# Altium integrated library ALTIUM-MJ_HORIZONTAL_PLASTIC-rev16a.IntLib: 68 symbols
Pins are listed as number, name and electrical type; pins without a type are passive.

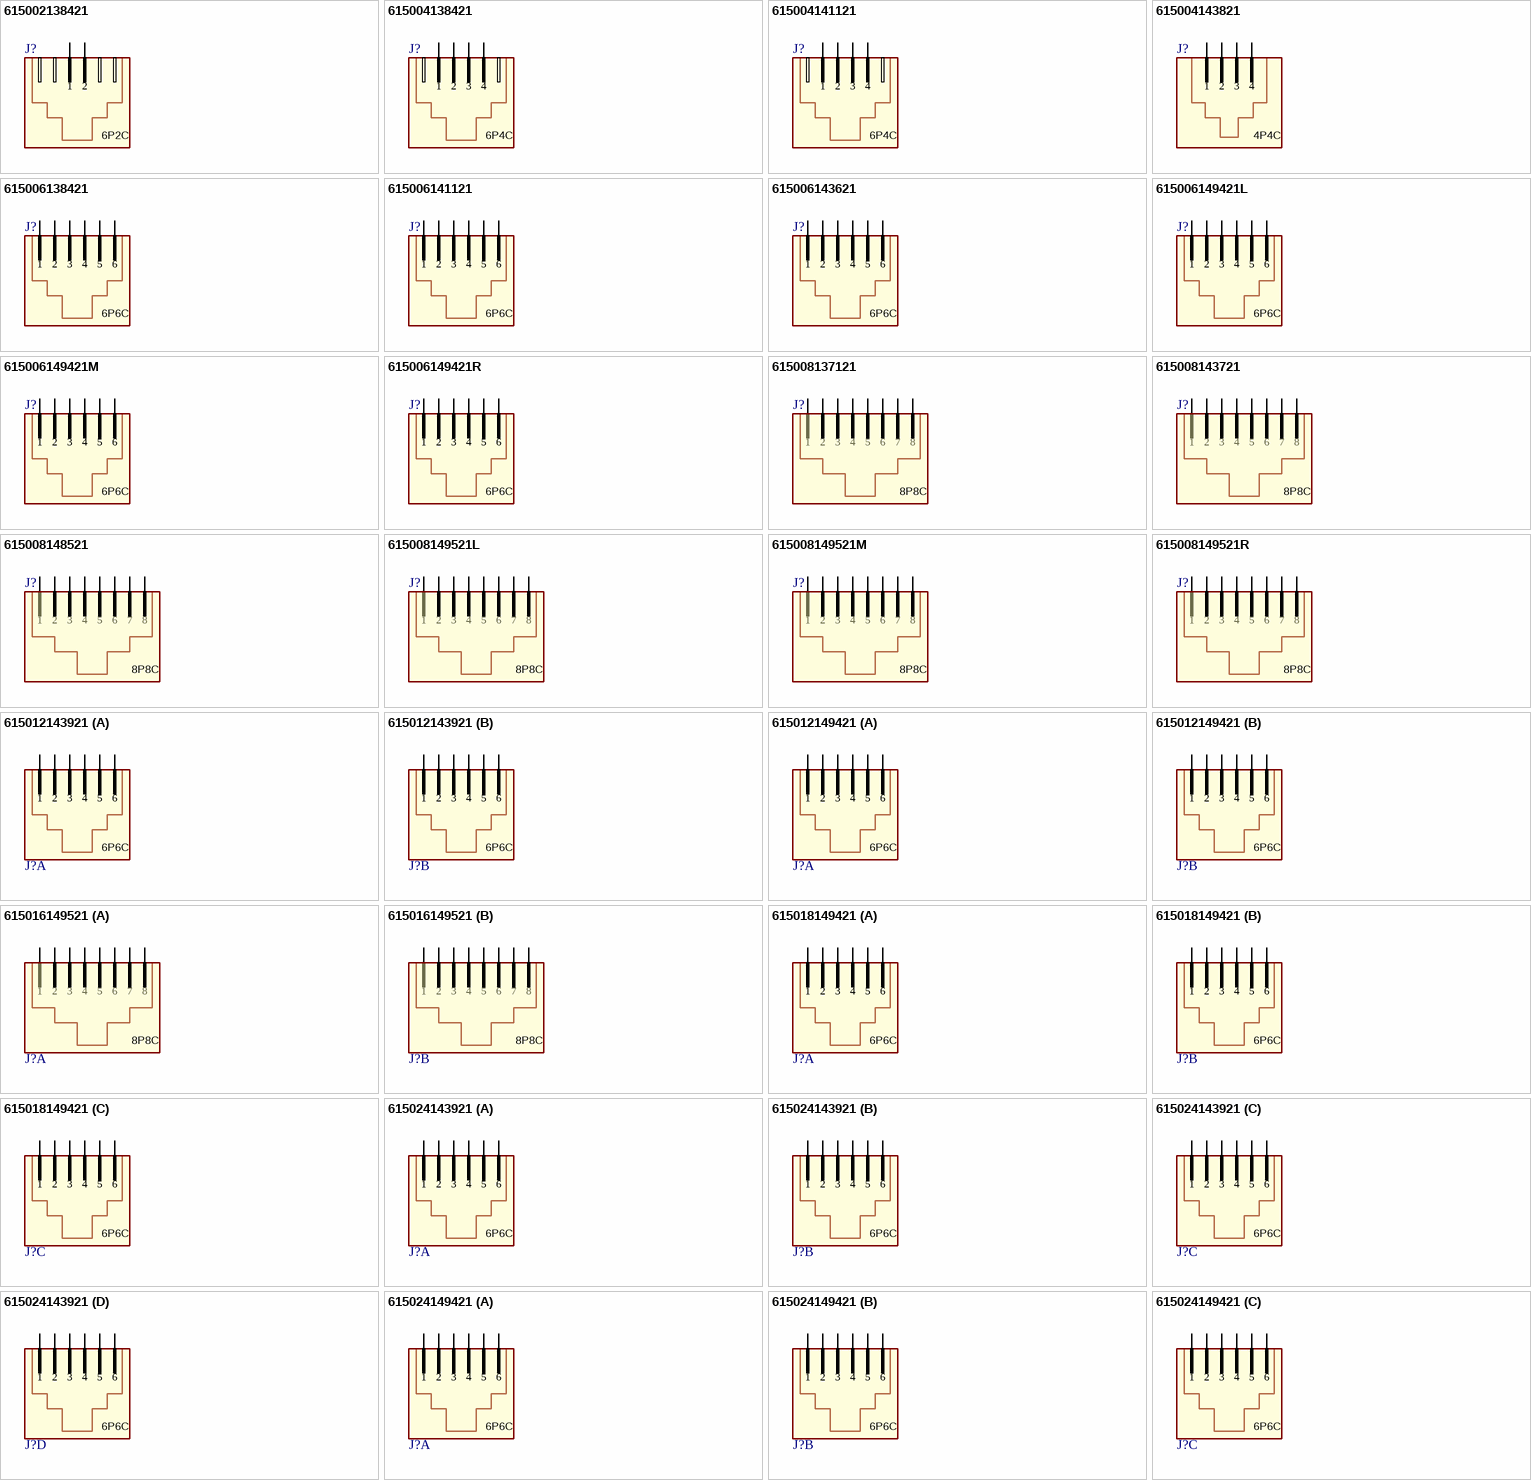
[diagram p0: symbols 615002138421 to 615024149421]

## 615002138421
designator J?
WR-MJ Modular Jack Horizontal Plastic 6P2C Tab Up; PartNumber: 615002138421; PublishedDate: July 2016; Publisher: Wurth Elektronik; ComponentLink1Description: Manufacturer; ComponentLink1URL: http://www.we-online.de; ComponentLink2Description: Datasheet; ComponentLink2URL: http://katalog.we-online.de/em/datasheet/615002138421.pdf; PinNumber: 6P2C
footprint 615002138421 (Horizontal Plastic 1x1 TH    6P2C Tab Up)
pins: 1, 2

## 615004138421
designator J?
WR-MJ Modular Jack Horizontal Plastic 6P4C Tab Up; PartNumber: 615004138421; PublishedDate: July 2016; Publisher: Wurth Elektronik; ComponentLink1Description: Manufacturer; ComponentLink1URL: http://www.we-online.de; ComponentLink2Description: Datasheet; ComponentLink2URL: http://katalog.we-online.de/em/datasheet/615004138421.pdf; PinNumber: 6P4C
footprint 615004138421 (Horizontal Plastic 1x1 TH    6P4C Tab Up)
pins: 1, 2, 3, 4

## 615004141121
designator J?
WR-MJ Modular Jack Horizontal Plastic 6P4C Tab Down; PartNumber: 615004141121; PublishedDate: July 2016; Publisher: Wurth Elektronik; ComponentLink1Description: Manufacturer; ComponentLink1URL: http://www.we-online.de; ComponentLink2Description: Datasheet; ComponentLink2URL: http://katalog.we-online.de/em/datasheet/615004141121.pdf; PinNumber: 6P4C
footprint 615004141121 (Horizontal Plastic 1x1 TH    6P4C Tab Down)
pins: 1, 2, 3, 4

## 615004143821
designator J?
WR-MJ Modular Jack Horizontal Plastic 4P4C Tab Up; PartNumber: 615004143821; PublishedDate: July 2016; Publisher: Wurth Elektronik; ComponentLink1Description: Manufacturer; ComponentLink1URL: http://www.we-online.de; ComponentLink2Description: Datasheet; ComponentLink2URL: http://katalog.we-online.de/em/datasheet/615004143821.pdf; PinNumber: 4P4C
footprint 615004143821 (Horizontal Plastic 1x1 TH    4P4C Tab Up)
pins: 1, 2, 3, 4

## 615006138421
designator J?
WR-MJ Modular Jack Horizontal Plastic 6P6C Tab Up; PartNumber: 615006138421; PublishedDate: July 2016; Publisher: Wurth Elektronik; ComponentLink1Description: Manufacturer; ComponentLink1URL: http://www.we-online.de; ComponentLink2Description: Datasheet; ComponentLink2URL: http://katalog.we-online.de/em/datasheet/615006138421.pdf; PinNumber: 6P6C
footprint 615006138421 (Horizontal Plastic 1x1 TH  6P6C Tab Up)
pins: 1, 2, 3, 4, 5, 6

## 615006141121
designator J?
WR-MJ Modular Jack Horizontal Plastic 6P6C Tab Down; PartNumber: 615006141121; PublishedDate: July 2016; Publisher: Wurth Elektronik; ComponentLink1Description: Manufacturer; ComponentLink1URL: http://www.we-online.de; ComponentLink2Description: Datasheet; ComponentLink2URL: http://katalog.we-online.de/em/datasheet/615006141121.pdf; PinNumber: 6P6C
footprint 615006141121 (Horizontal Plastic 1x1 TH    6P6C Tab Down)
pins: 1, 2, 3, 4, 5, 6

## 615006143621
designator J?
WR-MJ Modular Jack Horizontal Plastic 6P6C Tab Down; PartNumber: 615006143621; PublishedDate: July 2016; Publisher: Wurth Elektronik; ComponentLink1Description: Manufacturer; ComponentLink1URL: http://www.we-online.de; ComponentLink2Description: Datasheet; ComponentLink2URL: http://katalog.we-online.de/em/datasheet/615006143621.pdf; PinNumber: 6P6C
footprint 615006143621 (Horizontal Plastic 1x1 TH    6P6C Tab Down)
pins: 1, 2, 3, 4, 5, 6

## 615006149421L
designator J?
WR-MJ Modular Jack Horizontal Plastic 6P6C Assembly Tab Up; PartNumber: 615006149421L; PublishedDate: July 2016; Publisher: Wurth Elektronik; ComponentLink1Description: Manufacturer; ComponentLink1URL: http://www.we-online.de; ComponentLink2Description: Datasheet; ComponentLink2URL: http://katalog.we-online.de/em/datasheet/615006149421L.pdf; PinNumber: 6P6C
footprint 615006149421L (WR-MJ_Modular Jack_Tab UP_6P6C Assembly Left Housing)
pins: 1, 2, 3, 4, 5, 6

## 615006149421M
designator J?
WR-MJ Modular Jack Horizontal Plastic 6P6C Assembly Tab Up; PartNumber: 615006149421M; PublishedDate: July 2016; Publisher: Wurth Elektronik; ComponentLink1Description: Manufacturer; ComponentLink1URL: http://www.we-online.de; ComponentLink2Description: Datasheet; ComponentLink2URL: http://katalog.we-online.de/em/datasheet/615006149421M.pdf; PinNumber: 6P6C
footprint 615006149421M (WR-MJ_Modular Jack_Tab UP_6P6C Assembly Middlet Housing)
pins: 1, 2, 3, 4, 5, 6

## 615006149421R
designator J?
WR-MJ Modular Jack Horizontal Plastic 6P6C Assembly Tab Up; PartNumber: 615006149421R; PublishedDate: July 2016; Publisher: Wurth Elektronik; ComponentLink1Description: Manufacturer; ComponentLink1URL: http://www.we-online.de; ComponentLink2Description: Datasheet; ComponentLink2URL: http://katalog.we-online.de/em/datasheet/615006149421R.pdf; PinNumber: 6P6C
footprint 615006149421R (WR-MJ_Modular Jack_Tab UP_6P6C Assembly Right Housing)
pins: 1, 2, 3, 4, 5, 6

## 615008137121
designator J?
WR-MJ Modular Jack THT Horizontal Plastic 8P8C Tab Down; PartNumber: 615008137121; PublishedDate: July 2016; Publisher: Wurth Elektronik; ComponentLink1Description: Manufacturer; ComponentLink1URL: http://www.we-online.de; ComponentLink2Description: Datasheet; ComponentLink2URL: http://katalog.we-online.de/em/datasheet/615008137121.pdf; PinNumber: 8P8C
footprint 615008137121 (RJ45 Horizontal Tab down)
pins: 1, 2, 3, 4, 5, 6, 7, 8

## 615008143721
designator J?
WR-MJ Modular Jack Horizontal Plastic 8P8C Tab Down; PartNumber: 615008143721; PublishedDate: July 2016; Publisher: Wurth Elektronik; ComponentLink1Description: Manufacturer; ComponentLink1URL: http://www.we-online.de; ComponentLink2Description: Datasheet; ComponentLink2URL: http://katalog.we-online.de/em/datasheet/615008143721.pdf; PinNumber: 8P8C
footprint 615008143721 (Horizontal Plastic 1x1 TH    8P8C Tab Down)
pins: 1, 2, 3, 4, 5, 6, 7, 8

## 615008148521
designator J?
WR-MJ Modular Jack Horizontal Plastic 8P8C Tab Up; PartNumber: 615008148521; PublishedDate: July 2016; Publisher: Wurth Elektronik; ComponentLink1Description: Manufacturer; ComponentLink1URL: http://www.we-online.de; ComponentLink2Description: Datasheet; ComponentLink2URL: http://katalog.we-online.de/em/datasheet/615008148521.pdf; PinNumber: 8P8C
footprint 615008148521 (WR-MJ_Modular Jacks_Plastic  WR-MJ_Modular Jacks_Plastic_Horizontal_Tab UP)
pins: 1, 2, 3, 4, 5, 6, 7, 8

## 615008149521L
designator J?
WR-MJ Modular Jack Horizontal Plastic 8P8C Assembly Tab Up; PartNumber: 615008149521L; PublishedDate: July 2016; Publisher: Wurth Elektronik; ComponentLink1Description: Manufacturer; ComponentLink1URL: http://www.we-online.de; ComponentLink2Description: Datasheet; ComponentLink2URL: http://katalog.we-online.de/em/datasheet/615008149521L.pdf; PinNumber: 8P8C
footprint 615008149521L (WR-MJ_Modular Jack_Tab UP_8P8C Assembly Left Housing)
pins: 1, 2, 3, 4, 5, 6, 7, 8

## 615008149521M
designator J?
WR-MJ Modular Jack Horizontal Plastic 8P8C Assembly Tab Up; PartNumber: 615008149521M; PublishedDate: July 2016; Publisher: Wurth Elektronik; ComponentLink1Description: Manufacturer; ComponentLink1URL: http://www.we-online.de; ComponentLink2Description: Datasheet; ComponentLink2URL: http://katalog.we-online.de/em/datasheet/615008149521M.pdf; PinNumber: 8P8C
footprint 615008149521M (WR-MJ_Modular Jack_Tab UP_8P8C Assembly Left Housing)
pins: 1, 2, 3, 4, 5, 6, 7, 8

## 615008149521R
designator J?
WR-MJ Modular Jack Horizontal Plastic 8P8C Assembly Tab Up; PartNumber: 615008149521R; PublishedDate: July 2016; Publisher: Wurth Elektronik; ComponentLink1Description: Manufacturer; ComponentLink1URL: http://www.we-online.de; ComponentLink2Description: Datasheet; ComponentLink2URL: http://katalog.we-online.de/em/datasheet/615008149521R.pdf; PinNumber: 8P8C
footprint 615008149521R (WR-MJ_Modular Jack_Tab UP_8P8C Assembly Right Housing)
pins: 1, 2, 3, 4, 5, 6, 7, 8

## 615012143921
designator J?
WR-MJ Modular Jack THT Horizontal Plastic Dual Port 6P6C Tab Up; PartNumber: 615012143921; PinNumber: 6P6C x2; PublishedDate: July 2016; Publisher: Wurth Elektronik; ComponentLink1Description: Manufacturer; ComponentLink1URL: http://www.we-online.de; ComponentLink2Description: Datasheet; ComponentLink2URL: http://katalog.we-online.de/em/datasheet/615012143921.pdf
footprint 615012143921 (Horizontal Plastic 1x2 TH    6P6C Tab Up)
part A pins: A1, A2, A3, A4, A5, A6
part B pins: B1, B2, B3, B4, B5, B6
part A text: 1; 2; 3; 4; 5; 6; 6P6C
part B text: 1; 2; 3; 4; 5; 6; 6P6C

## 615012149421
designator J?
WR-MJ Modular Jack Horizontal Plastic 6P6C Assembly Tab Up; PartNumber: 615012149421; PinNumber: 6P6C x2; PublishedDate: July 2016; Publisher: Wurth Elektronik; ComponentLink1Description: Manufacturer; ComponentLink1URL: http://www.we-online.de; ComponentLink2Description: Datasheet; ComponentLink2URL: http://katalog.we-online.de/em/datasheet/6150xx149421.pdf
footprint 615012149421 (WR-MJ_Modular Jack_Tab UP_6P6C  Pre-Assembly 1x2)
part A pins: A1, A2, A3, A4, A5, A6
part B pins: B1, B2, B3, B4, B5, B6
part A text: 1; 2; 3; 4; 5; 6; 6P6C
part B text: 1; 2; 3; 4; 5; 6; 6P6C

## 615016149521
designator J?
WR-MJ Modular Jack Horizontal Plastic 8P8C Assembly Tab Up; PartNumber: 615016149521; PinNumber: 8P8C x2; PublishedDate: July 2016; Publisher: Wurth Elektronik; ComponentLink1Description: Manufacturer; ComponentLink1URL: http://www.we-online.de; ComponentLink2Description: Datasheet; ComponentLink2URL: http://katalog.we-online.de/em/datasheet/6150xx149521.pdf
footprint 615016149521 (WR-MJ_Modular Jack_Tab UP_8P8C Pre-Assembly 1x2)
part A pins: A1, A2, A3, A4, A5, A6, A7, A8
part B pins: B1, B2, B3, B4, B5, B6, B7, B8
part A text: 1; 2; 3; 4; 5; 6; 7; 8; 8P8C
part B text: 1; 2; 3; 4; 5; 6; 7; 8; 8P8C

## 615018149421
designator J?
WR-MJ Modular Jack Horizontal Plastic 6P6C Assembly Tab Up; PartNumber: 615018149421; PinNumber: 6P6C x3; PublishedDate: July 2016; Publisher: Wurth Elektronik; ComponentLink1Description: Manufacturer; ComponentLink1URL: http://www.we-online.de; ComponentLink2Description: Datasheet; ComponentLink2URL: http://katalog.we-online.de/em/datasheet/6150xx149421.pdf
footprint 615018149421 (WR-MJ_Modular Jack_Tab UP_6P6C Pre-Assembly 1x3)
part A pins: A1, A2, A3, A4, A5, A6
part B pins: B1, B2, B3, B4, B5, B6
part C pins: C1, C2, C3, C4, C5, C6
part A text: 1; 2; 3; 4; 5; 6; 6P6C
part B text: 1; 2; 3; 4; 5; 6; 6P6C
part C text: 1; 2; 3; 4; 5; 6; 6P6C

## 615024143921
designator J?
WR-MJ Modular Jack THT Horizontal Plastic 4Port 6P6C Tab Up; PartNumber: 615024143921; PinNumber: 6P6C x4; PublishedDate: July 2016; Publisher: Wurth Elektronik; ComponentLink1Description: Manufacturer; ComponentLink1URL: http://www.we-online.de; ComponentLink2Description: Datasheet; ComponentLink2URL: http://katalog.we-online.de/em/datasheet/615024143921.pdf
footprint 615024143921 (Horizontal Plastic 1x4 TH    6P6C Tab Up)
part A pins: A1, A2, A3, A4, A5, A6
part B pins: B1, B2, B3, B4, B5, B6
part C pins: C1, C2, C3, C4, C5, C6
part D pins: D1, D2, D3, D4, D5, D6
part A text: 1; 2; 3; 4; 5; 6; 6P6C
part B text: 1; 2; 3; 4; 5; 6; 6P6C
part C text: 1; 2; 3; 4; 5; 6; 6P6C
part D text: 1; 2; 3; 4; 5; 6; 6P6C

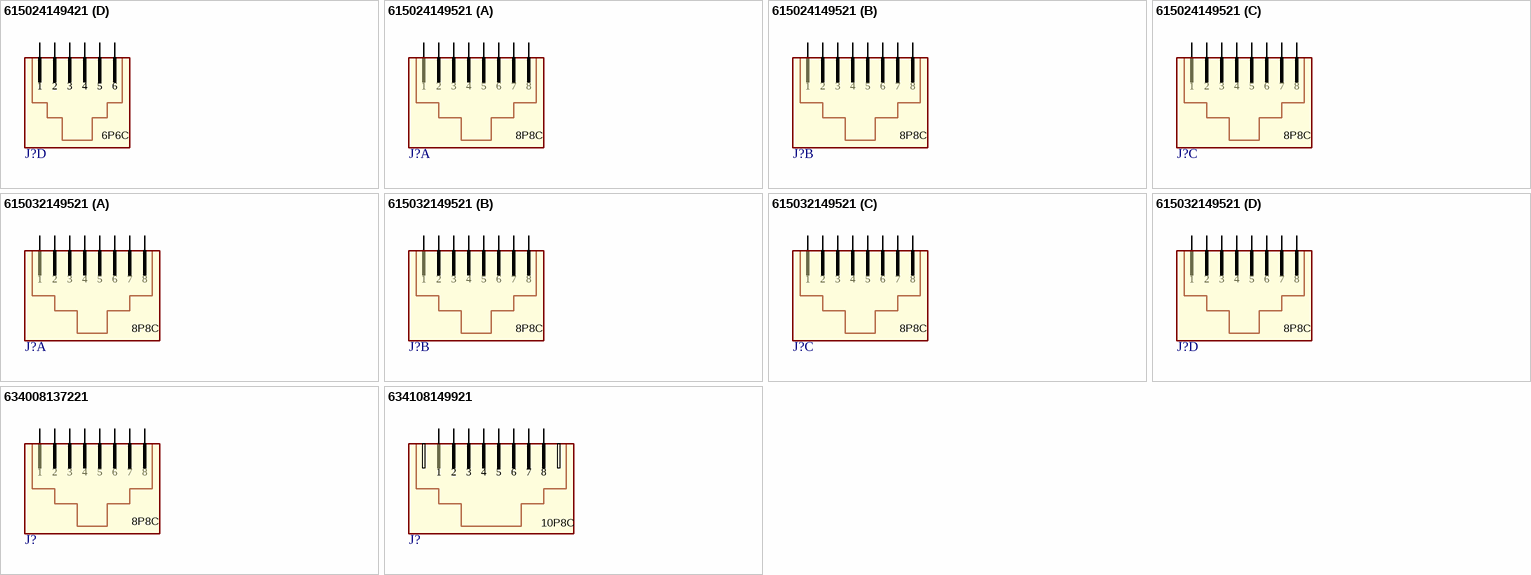
[diagram p1: symbols 615024149421 to 634108149921]

## 615024149421
designator J?
WR-MJ Modular Jack Horizontal Plastic 6P6C Assembly Tab Up; PartNumber: 615024149421; PinNumber: 6P6C x4; PublishedDate: July 2016; Publisher: Wurth Elektronik; ComponentLink1Description: Manufacturer; ComponentLink1URL: http://www.we-online.de; ComponentLink2Description: Datasheet; ComponentLink2URL: http://katalog.we-online.de/em/datasheet/6150xx149421.pdf
footprint 615024149421 (WR-MJ_Modular Jack_Tab UP_6P6C Pre-Assembly 1x4)
part A pins: A1, A2, A3, A4, A5, A6
part B pins: B1, B2, B3, B4, B5, B6
part C pins: C1, C2, C3, C4, C5, C6
part D pins: D1, D2, D3, D4, D5, D6
part A text: 1; 2; 3; 4; 5; 6; 6P6C
part B text: 1; 2; 3; 4; 5; 6; 6P6C
part C text: 1; 2; 3; 4; 5; 6; 6P6C
part D text: 1; 2; 3; 4; 5; 6; 6P6C

## 615024149521
designator J?
WR-MJ Modular Jack Horizontal Plastic 8P8C Assembly Tab Up; PartNumber: 615024149521; PinNumber: 8P8C x3; PublishedDate: July 2016; Publisher: Wurth Elektronik; ComponentLink1Description: Manufacturer; ComponentLink1URL: http://www.we-online.de; ComponentLink2Description: Datasheet; ComponentLink2URL: http://katalog.we-online.de/em/datasheet/6150xx149521.pdf
footprint 615024149521 (WR-MJ_Modular Jack_Tab UP_8P8C Pre-Assembly 1x3)
part A pins: A1, A2, A3, A4, A5, A6, A7, A8
part B pins: B1, B2, B3, B4, B5, B6, B7, B8
part C pins: C1, C2, C3, C4, C5, C6, C7, C8
part A text: 1; 2; 3; 4; 5; 6; 7; 8; 8P8C
part B text: 1; 2; 3; 4; 5; 6; 7; 8; 8P8C
part C text: 1; 2; 3; 4; 5; 6; 7; 8; 8P8C

## 615032149521
designator J?
WR-MJ Modular Jack Horizontal Plastic 8P8C Assembly Tab Up; PartNumber: 615032149521; PinNumber: 8P8C x4; PublishedDate: July 2016; Publisher: Wurth Elektronik; ComponentLink1Description: Manufacturer; ComponentLink1URL: http://www.we-online.de; ComponentLink2Description: Datasheet; ComponentLink2URL: http://katalog.we-online.de/em/datasheet/6150xx149521.pdf
footprint 615032149521 (WR-MJ_Modular Jack_Tab UP_8P8C Pre-Assembly 1x3)
part A pins: A1, A2, A3, A4, A5, A6, A7, A8
part B pins: B1, B2, B3, B4, B5, B6, B7, B8
part C pins: C1, C2, C3, C4, C5, C6, C7, C8
part D pins: D1, D2, D3, D4, D5, D6, D7, D8
part A text: 1; 2; 3; 4; 5; 6; 7; 8; 8P8C
part B text: 1; 2; 3; 4; 5; 6; 7; 8; 8P8C
part C text: 1; 2; 3; 4; 5; 6; 7; 8; 8P8C
part D text: 1; 2; 3; 4; 5; 6; 7; 8; 8P8C

## 634008137221
designator J?
WR-MJ Modular Jack SMT Horizontal Plastic 8P8C Tab Down; PartNumber: 634008137221; PublishedDate: July 2016; Publisher: Wurth Elektronik; ComponentLink1Description: Manufacturer; ComponentLink1URL: http://www.we-online.de; ComponentLink2Description: Datasheet; ComponentLink2URL: http://katalog.we-online.de/em/datasheet/634008137221.pdf; PinNumber: 8P8C
footprint 634008137221 (RJ45 Horizontal SMT Tab down)
pins: 1, 2, 3, 4, 5, 6, 7, 8

## 634108149921
designator J?
WR-MJ Modular Jack SMT Horizontal Plastic Low Profile 10P8C Tab Down; PartNumber: 634108149921; PublishedDate: July 2016; Publisher: Wurth Elektronik; ComponentLink1Description: Manufacturer; ComponentLink1URL: http://www.we-online.de; ComponentLink2Description: Datasheet; ComponentLink2URL: http://katalog.we-online.de/em/datasheet/634108149921.pdf; PinNumber: 10P8C
footprint 634108149921 (WR-MJ_Modular Jack_Tab DOWN_10P8C)
pins: 1, 2, 3, 4, 5, 6, 7, 8


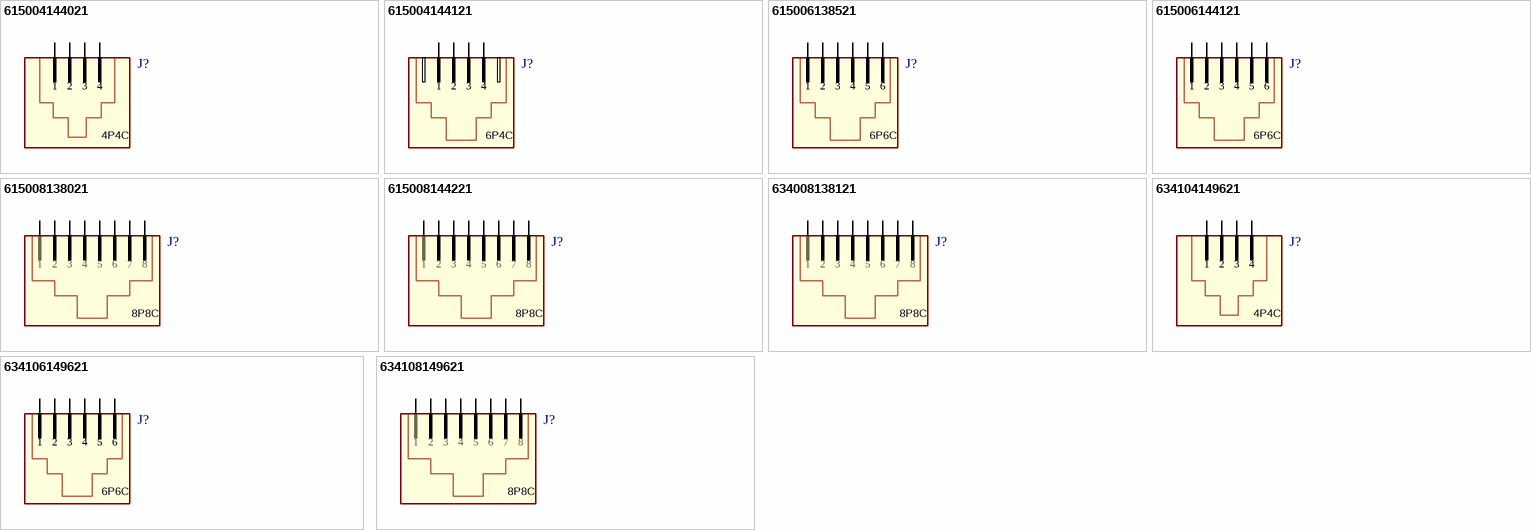
[diagram p2: symbols 615004144021 to 634108149621]

## 615004144021
designator J?
WR-MJ Modular Jack Vertical Plastic 4P4C w. Ears; PartNumber: 615004144021; PublishedDate: July 2016; Publisher: Wurth Elektronik; ComponentLink1Description: Manufacturer; ComponentLink1URL: http://www.we-online.de; ComponentLink2Description: Datasheet; ComponentLink2URL: http://katalog.we-online.de/em/datasheet/615004144021.pdf; PinNumber: 4P4C
footprint 615004144021 (Vertical Plastic 1x1 TH    4P4C)
pins: 1, 2, 3, 4

## 615004144121
designator J?
WR-MJ Modular Jack Vertical Plastic 6PxC w. Ears; PartNumber: 615004144121; PinNumber: 6P4C; PublishedDate: July 2016; Publisher: Wurth Elektronik; ComponentLink1Description: Manufacturer; ComponentLink1URL: http://www.we-online.de; ComponentLink2Description: Datasheet; ComponentLink2URL: http://katalog.we-online.de/em/datasheet/615004144121.pdf
footprint 615004144121 (Vertical Plastic 1x1 TH    6P4C)
pins: 1, 2, 3, 4

## 615006138521
designator J?
WR-MJ Modular Jack Vertical Plastic 6P6C w. Ears; PartNumber: 615006138521; PublishedDate: July 2016; Publisher: Wurth Elektronik; ComponentLink1Description: Manufacturer; ComponentLink1URL: http://www.we-online.de; ComponentLink2Description: Datasheet; ComponentLink2URL: http://katalog.we-online.de/em/datasheet/615006138521.pdf; PinNumber: 6P6C
footprint 615006138521 (6P6C vertical with ears)
pins: 1, 2, 3, 4, 5, 6

## 615006144121
designator J?
WR-MJ Modular Jack Vertical Plastic 6P6C w. Ears; PartNumber: 615006144121; PublishedDate: July 2016; Publisher: Wurth Elektronik; ComponentLink1Description: Manufacturer; ComponentLink1URL: http://www.we-online.de; ComponentLink2Description: Datasheet; ComponentLink2URL: http://katalog.we-online.de/em/datasheet/615006144121.pdf; PinNumber: 6P6C
footprint 615006144121 (Vertical Plastic 1x1 TH    6P6C)
pins: 1, 2, 3, 4, 5, 6

## 615008138021
designator J?
WR-MJ Modular Jack Vertical Plastic 8P8C; PartNumber: 615008138021; PublishedDate: July 2016; Publisher: Wurth Elektronik; ComponentLink1Description: Manufacturer; ComponentLink1URL: http://www.we-online.de; ComponentLink2Description: Datasheet; ComponentLink2URL: http://katalog.we-online.de/em/datasheet/615008138021.pdf; PinNumber: 8P8C
footprint 615008138021 (RJ45 Vertical)
pins: 1, 2, 3, 4, 5, 6, 7, 8

## 615008144221
designator J?
WR-MJ Modular Jack Vertical Plastic 8P8C w. Ears; PartNumber: 615008144221; PublishedDate: July 2016; Publisher: Wurth Elektronik; ComponentLink1Description: Manufacturer; ComponentLink1URL: http://www.we-online.de; ComponentLink2Description: Datasheet; ComponentLink2URL: http://katalog.we-online.de/em/datasheet/615008144221.pdf; PinNumber: 8P8C
footprint 615008144221 (Vertical Plastic 1x1 TH    8P8C)
pins: 1, 2, 3, 4, 5, 6, 7, 8

## 634008138121
designator J?
WR-MJ Modular Jack SMT Vertical Plastic 8P8C; PartNumber: 634008138121; PublishedDate: July 2016; Publisher: Wurth Elektronik; ComponentLink1Description: Manufacturer; ComponentLink1URL: http://www.we-online.de; ComponentLink2Description: Datasheet; ComponentLink2URL: http://katalog.we-online.de/em/datasheet/634008138121.pdf; PinNumber: 8P8C
footprint 634008138121 (RJ45 Vertical SMT)
pins: 1, 2, 3, 4, 5, 6, 7, 8

## 634104149621
designator J?
WR-MJ Modular Jack SMT Vertical Plastic 4P4C Top Entry; PartNumber: 634104149621; PublishedDate: July 2016; Publisher: Wurth Elektronik; ComponentLink1Description: Manufacturer; ComponentLink1URL: http://www.we-online.de; ComponentLink2Description: Datasheet; ComponentLink2URL: http://katalog.we-online.de/em/datasheet/634104149621.pdf; PinNumber: 4P4C
footprint 634104149621 (WR-MJ_Modular Jack_Top Entry_4P4C T&R with Mylar for Pick & Place)
pins: 1, 2, 3, 4

## 634106149621
designator J?
WR-MJ Modular Jack SMT Vertical Plastic 6P6C Top Entry; PartNumber: 634106149621; PublishedDate: July 2016; Publisher: Wurth Elektronik; ComponentLink1Description: Manufacturer; ComponentLink1URL: http://www.we-online.de; ComponentLink2Description: Datasheet; ComponentLink2URL: http://katalog.we-online.de/em/datasheet/634106149621.pdf; PinNumber: 6P6C
footprint 634106149621 (WR-MJ_Modular Jack_Top Entry_6P6C T&R with Mylar for Pick & Place)
pins: 1, 2, 3, 4, 5, 6

## 634108149621
designator J?
WR-MJ Modular Jack SMT Vertical Plastic 8P8C Top Entry; PartNumber: 634108149621; PublishedDate: July 2016; Publisher: Wurth Elektronik; ComponentLink1Description: Manufacturer; ComponentLink1URL: http://www.we-online.de; ComponentLink2Description: Datasheet; ComponentLink2URL: http://katalog.we-online.de/em/datasheet/634108149621.pdf; PinNumber: 8P8C
footprint 634108149621 (WR-MJ_Modular Jack_Top Entry_8P8C T&R with Mylar for Pick & Place)
pins: 1, 2, 3, 4, 5, 6, 7, 8

